# Altium footprint library ACTION_非标准杂项.pcblib: 82 footprints (part 2 of 6)
Each footprint in its own frame and in the unit in brackets; x right, y up, seen from the top. Pads: shape width x height; smd on the part's side, far side on the other; paste and mask are expansions set on the pad; w line width, h text height; cw(c..) or ccw(c..) is an arc to the next point about the centre after c.
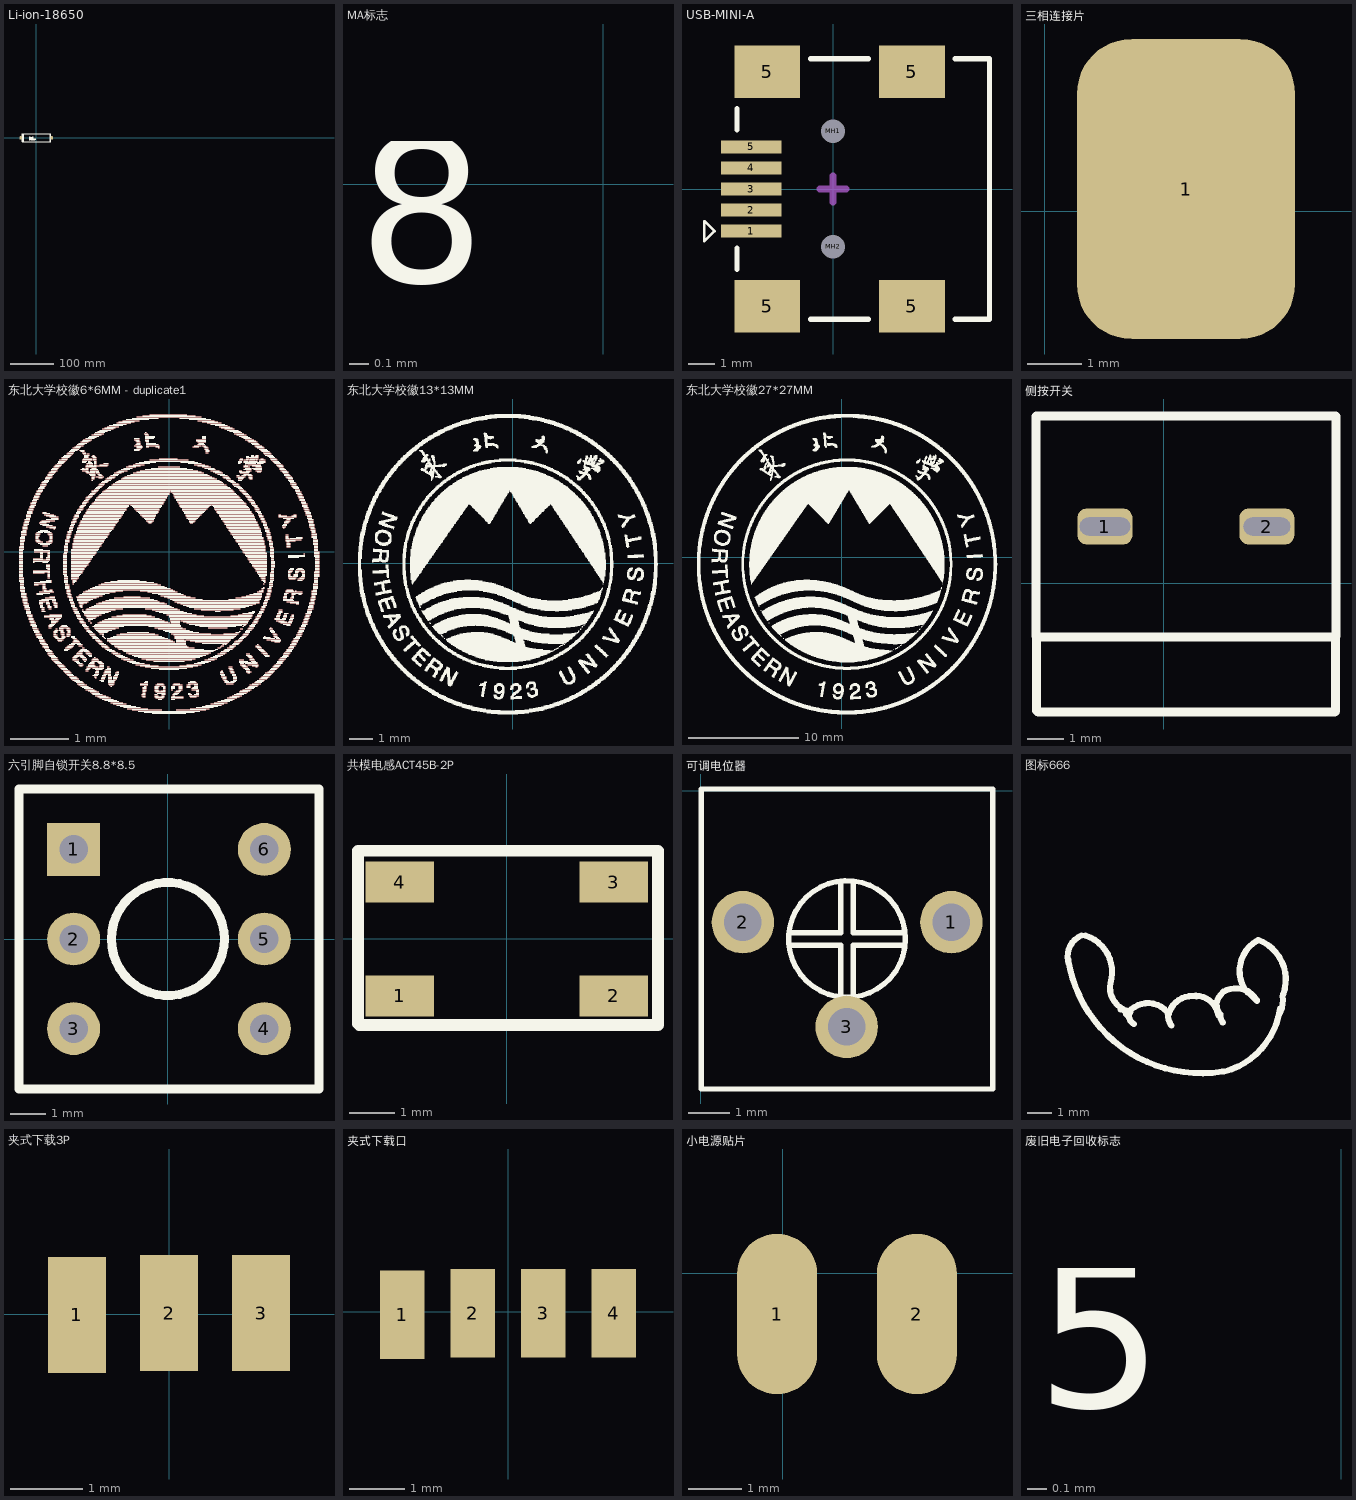
[diagram p1: the footprints below, top view; thin cyan lines are the x and y axes]

## Li-ion-18650 [mm]
pads (2):
  rrect50% 5x8 smd: 1(-35.5,0) 2(35.5,0)
Top Overlay:
  drawing of 1009 lines, arcs and shapes, not listed
3D body "User Library-18650-1.STEP": height 18.1, standoff 0.1, extent -32.5,-9 32.6,9

## MA标志 [mm]
Top Overlay:
  text "8" at -1.245,-0.787 h1.52

## USB-MINI-A [mm] "MINI型USB，7.9*7.5*4.1mm"
pads (11):
  rect 2.3x0.5 smd: 1(-3.108,-1.6) 2(-3.108,-0.8) 3(-3.108,0) 4(-3.108,0.8) 5(-3.108,1.6)
  rect 2.5x2 smd: 5(-2.5,-4.45) 5(-2.5,4.45) 5(3,-4.45) 5(3,4.45)
  round 0.6 hole 0.9 unplated: MH1(0,2.2) MH2(0,-2.2)
Top Overlay:
  lines w0.1: -4.886,-1.981 -4.886,-1.219 -4.505,-1.6 -4.886,-1.981
  lines w0.2: -3.65,-3.05 -3.65,-2.25 ; -3.65,2.25 -3.65,3.05 ; -0.85,-4.95 1.35,-4.95 ; -0.85,4.95 1.35,4.95 ; 4.65,-4.95 5.95,-4.95 5.95,4.95 4.65,4.95
Mechanical 15:
  lines w0.254: -0.508,0 0.508,0 ; 0,-0.508 0,0.508
3D body "USB MINI B型 贴片-": height 3.95, standoff -0.7, extent -3.7,-4.75 6,4.75

## 三相连接片 [mm]
pads (1):
  rrect50% 4x5.5 smd: 1(2.591,0.406)

## 东北大学校徽6*6MM - duplicate1 [mm]
height 1.22
Top Layer:
  drawing of 1885 lines, arcs and shapes, not listed
Top Overlay:
  drawing of 1885 lines, arcs and shapes, not listed

## 东北大学校徽13*13MM [mm]
Top Overlay:
  drawing of 3824 lines, arcs and shapes, not listed

## 东北大学校徽27*27MM [mm]
Top Overlay:
  drawing of 8197 lines, arcs and shapes, not listed

## 侧按开关 [mil]
pads (2):
  rrect50% 60x39.37 hole 19.68 slot 55.12 at 0 deg: 1(-64,62)
  rrect50% 60x39.37 hole 19.68 slot 51.18 at 0 deg: 2(113,62)
Top Overlay:
  lines w10: -139.42,-58 -139.42,182.16 ; -139,-57.39 -139,-139 -137,-141 121,-141 ; -138.8,-59 187.97,-59 ; -138.8,183 187.97,183 ; 120,-141 187,-141 188,-140 188,-58 ; 188.58,-58 188.58,182.16

## 六引脚自锁开关8.8*8.5 [mm]
pads (6):
  rect 1.5x1.5 hole 0.8: 1(-2.667,2.54)
  round 1.5 hole 0.8: 2(-2.667,0) 3(-2.667,-2.54) 4(2.733,-2.54) 5(2.733,0) 6(2.733,2.54)
Top Overlay:
  circle w0.254: c0,0 r1.6
  lines w0.254: -4.217,-4.25 4.283,-4.25 4.283,4.25 -4.217,4.25 -4.217,-4.25

## 共模电感ACT45B-2P [mm]
pads (4):
  rect 1.5x0.9 smd: 1(-2.337,-1.245) 2(2.337,-1.245) 3(2.337,1.245) 4(-2.337,1.245)
Top Overlay:
  lines w0.254: -3.251,-1.854 -3.226,-1.88 3.302,-1.88 3.302,1.93 3.226,1.93 -3.251,1.93 -3.251,-1.854

## 可调电位器 [mm]
pads (3):
  round 1.5 hole 0.9: 1(6.02,-3.15) 2(1.016,-3.15) 3(3.505,-5.664)
Top Overlay:
  circle w0.127: c3.513,-3.554 r1.4
  lines w0.127: 2.121,-3.704 3.363,-3.704 3.363,-4.945 ; 2.121,-3.404 3.363,-3.404 3.363,-2.162 ; 3.663,-4.945 3.663,-3.704 4.905,-3.704 ; 3.663,-2.162 3.663,-3.404 4.905,-3.404 ; 0.013,-7.154 7.013,-7.154 7.013,0.046 0.013,0.046 0.013,-7.154

## 图标666 [mm]
Top Overlay:
  lines w0.254: 1265.555,1270.152 ccw(c1271.092,1271.016) 1271.956,1265.479 ; 1265.594,1269.933 cw(c1266.469,1270.279) 1266.099,1271.144 ; 1266.266,1271.143 cw(c1265.796,1269.632) 1267.308,1269.162 ccw(c1268.324,1268.984) 1268.146,1267.968 ; 1267.739,1268.07 1267.816,1268.07 1268.019,1267.866 ; 1267.968,1268.019 1267.968,1267.866 1268.044,1267.79 ; 1268.12,1267.943 ccw(c1268.451,1267.79) 1268.298,1267.46 ; 1268.171,1268.07 cw(c1268.87,1267.269) 1269.67,1267.968 ; 1269.695,1267.917 ccw(c1270.559,1267.892) 1269.847,1267.402 ; 1269.733,1267.839 cw(c1270.693,1267.643) 1270.889,1268.603 ; 1270.711,1268.628 cw(c1270.851,1267.676) 1271.803,1267.816 ; 1271.88,1267.79 ccw(c1272.515,1267.892) 1271.986,1267.526 ; 1271.88,1267.866 cw(c1272.324,1268.26) 1271.93,1268.705 ; 1272.007,1268.806 cw(c1272.527,1267.93) 1273.404,1268.451 ; 1272.032,1265.479 ccw(c1271.245,1268.527) 1274.363,1268.096 ; 1272.87,1268.959 cw(c1274.14,1269.67) 1273.429,1270.94 ; 1273.023,1268.832 1273.023,1268.781 1273.048,1268.781 1273.404,1268.425 ; 1273.454,1270.965 cw(c1272.832,1269.302) 1274.496,1268.679 ; 1274.318,1267.841 ccw(c1273.283,1268.45) 1274.471,1268.627

## 夹式下载3P [mm]
pads (3):
  rect 0.8x1.6 smd: 1(-1.27,-0.013) 2(0,0.013) 3(1.27,0.013)

## 夹式下载口 [mm]
pads (4):
  rect 0.8x1.6 smd: 1(-1.905,-0.051) 2(-0.635,-0.025) 3(0.635,-0.025) 4(1.905,-0.025)

## 小电源贴片 [mm] "Connector; Header; 10x2 Position"
pads (2):
  oval 1.5x3 smd: 1(-0.102,-0.762) 2(2.515,-0.762)

## 废旧电子回收标志 [mm]
Top Overlay:
  text "5" at -1.549,-2.565 h1.52